# Altium footprint library Sajad_Altium_Library.PcbLib: 333 footprints (part 4 of 21)
Each footprint in its own frame and in the unit in brackets; x right, y up, seen from the top. Pads: shape width x height; smd on the part's side, far side on the other; paste and mask are expansions set on the pad; w line width, h text height; cw(c..) or ccw(c..) is an arc to the next point about the centre after c.
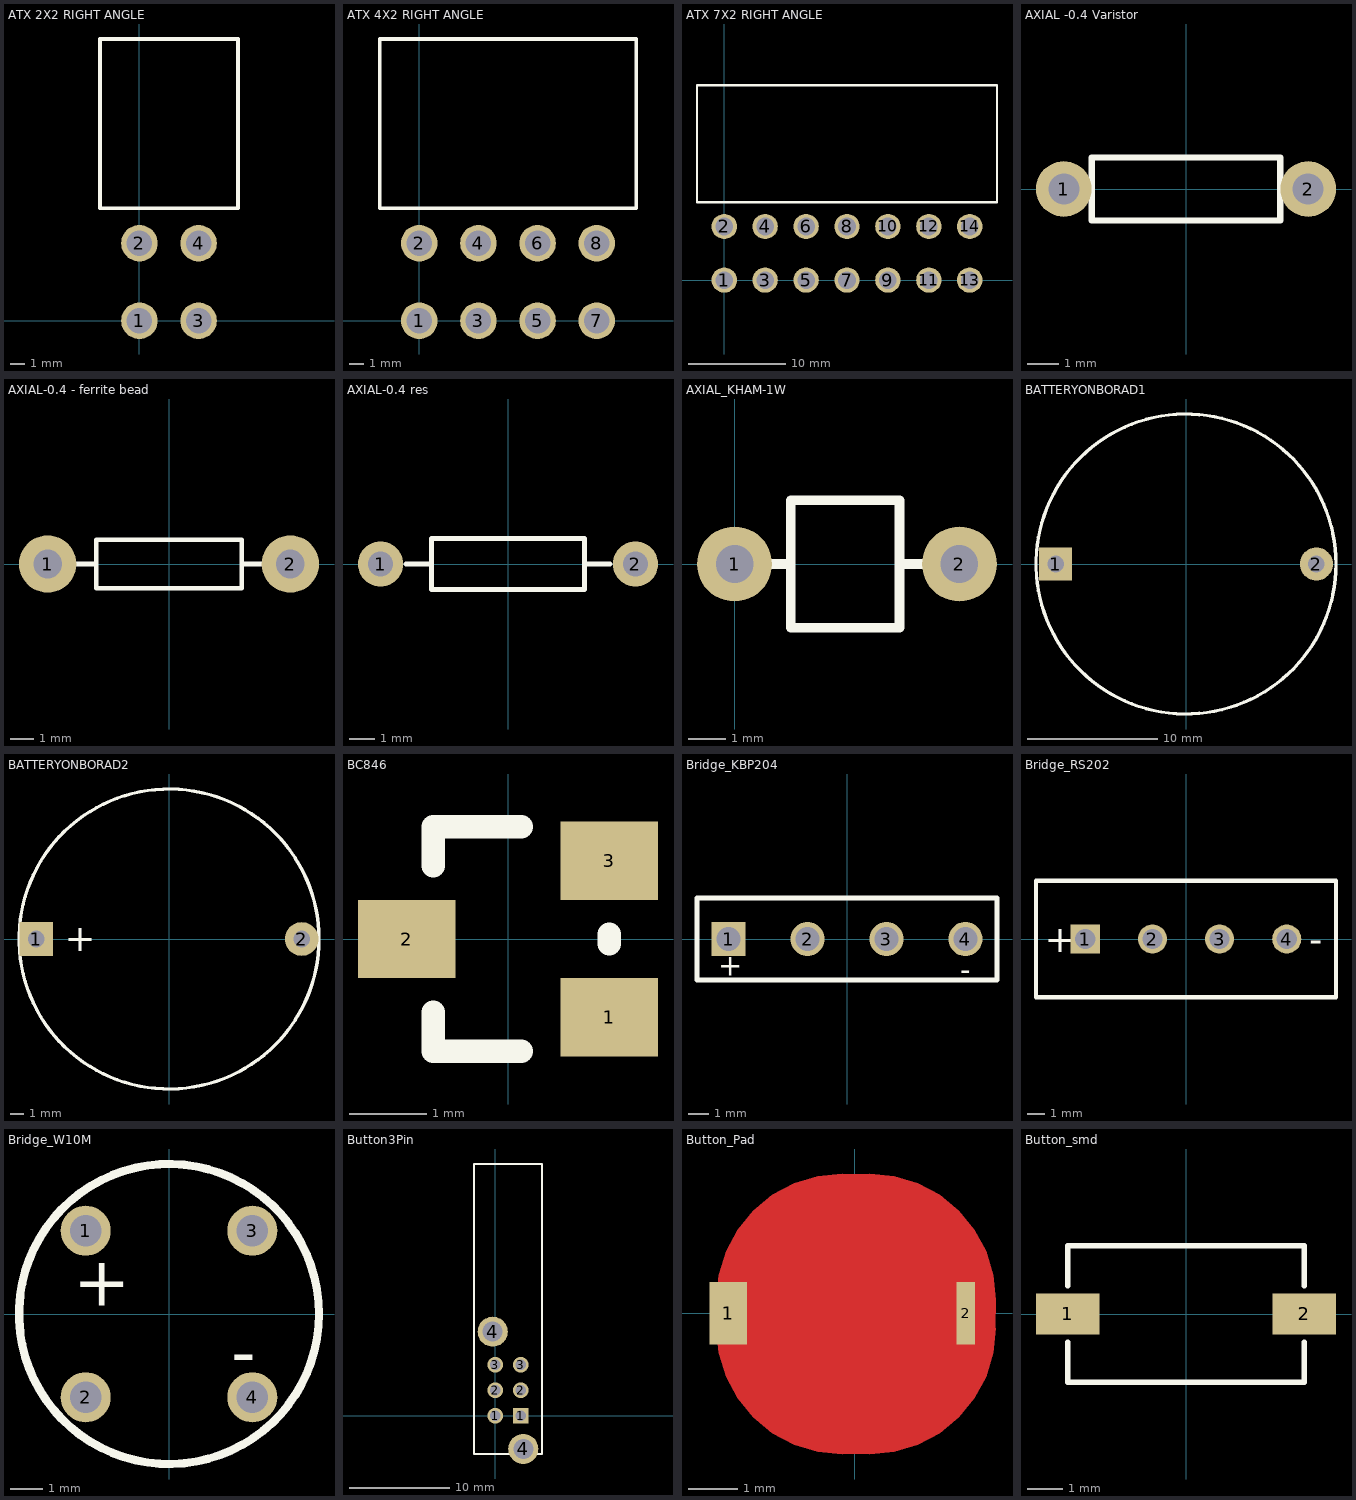
[diagram p3: the footprints below, top view; thin cyan lines are the x and y axes]

## ATX 2X2 RIGHT ANGLE [mm]
pads (4):
  round 2.6 hole 1.8: 1(0,0) 2(0,5.5) 3(4.2,0) 4(4.2,5.5)
Top Overlay:
  lines w0.254: -2.8,7.986 7,7.986 ; -2.8,8 -2.8,20 7,20 7,8

## ATX 4X2 RIGHT ANGLE [mm]
pads (8):
  round 2.6 hole 1.8: 1(0,0) 2(0,5.5) 3(4.2,0) 4(4.2,5.5) 5(8.4,0) 6(8.4,5.5) 7(12.6,0) 8(12.6,5.5)
Top Overlay:
  lines w0.254: -2.8,7.986 15.4,7.986 ; -2.8,8 -2.8,20 15.4,20 15.4,8

## ATX 7X2 RIGHT ANGLE [mm]
pads (14):
  round 2.6 hole 1.8: 1(0,0) 2(0,5.5) 3(4.2,0) 4(4.2,5.5) 5(8.4,0) 6(8.4,5.5) 7(12.6,0) 8(12.6,5.5) 9(16.8,0) 10(16.8,5.5) 11(21,0) 12(21,5.5) 13(25.2,0) 14(25.2,5.5)
Top Overlay:
  lines w0.254: -2.8,7.986 28,7.986 28,20 -2.8,20 -2.8,8

## AXIAL -0.4 Varistor [mm] "Axial Device, Thru-Hole; 2 Leads; 0.4 in Pin Spacing"
height 2.032
pads (2):
  round 1.8 hole 1: 1(-3.95,0) 2(3.95,0)
Top Overlay:
  lines w0.2: -3.048,-1.016 3.048,-1.016 3.048,1.016 -3.048,1.016 -3.048,-1.016

## AXIAL-0.4 - ferrite bead [mm] "Axial Device, Thru-Hole; 2 Leads; 0.4 in Pin Spacing"
height 2.032
pads (2):
  round 2.4 hole 1.2: 1(-5.08,0) 2(5.08,0)
Top Overlay:
  lines w0.2: -4.064,0 -3.048,0 ; 3.048,0 4.064,0 ; -3.048,-1.016 -3.048,1.016 3.048,1.016 3.048,-1.016 -3.048,-1.016
3D body: height 2.75, standoff -3, extent -5.25,-1.25 5.25,1.25

## AXIAL-0.4 res [mm] "Axial Device, Thru-Hole; 2 Leads; 0.4 in Pin Spacing"
height 2.032
pads (2):
  round 1.8 hole 1: 1(-5.08,0) 2(5.08,0)
Top Overlay:
  lines w0.2: -4.064,0 -3.048,0 ; 3.048,0 4.064,0 ; -3.048,-1.016 -3.048,1.016 3.048,1.016 3.048,-1.016 -3.048,-1.016
3D body: height 2.43, standoff -3.04, extent -5.385,-1.156 5.385,1.156

## AXIAL_KHAM-1W [mm]
pads (2):
  round 2 hole 1: 1(0,0) 2(6,0)
Top Overlay:
  lines w0.254: 0,0 1.5,0 ; 4.4,0 6,0 ; 1.5,-1.7 1.5,1.7 4.4,1.7 4.4,-1.7 1.5,-1.7

## BATTERYONBORAD1 [mm]
pads (2):
  rect 2.54x2.54 hole 1.27: 1(-10,0)
  round 2.54 hole 1.27: 2(10,0)
Top Overlay:
  circle w0.254: c0,0 r11.5
3D body: height 8.71, standoff -3.97, extent -12.288,-11.39 16.352,11.39

## BATTERYONBORAD2 [mm]
pads (2):
  rect 2.54x2.54 hole 1.27: 1(-10,0)
  round 2.54 hole 1.27: 2(10,0)
Top Overlay:
  circle w0.254: c0,0 r11.3
  text "+" at -7.849,-0.94 h2.03
3D body: height 3.55, standoff -5.5, extent -14.5,-10 14.5,10

## BC846 [mil]
pads (3):
  rect 50x40 smd: 1(51.75,-40) 2(-51.75,0) 3(51.75,40)
Top Overlay:
  lines w12: -38.25,-37.5 -38.25,-57.5 6.75,-57.5 ; -38.25,37.5 -38.25,57.5 6.75,57.5 ; 51.75,-2.5 51.75,2.5
3D body: height 39.37, standoff -3.94, extent -59.53,-59.06 64.01,59.05

## Bridge_KBP204 [mil] "KBP204 Diode Bridge"
pads (4):
  rect 65x65 hole 45: 1(-225,0)
  round 65 hole 45: 2(-75,0) 3(75,0) 4(225,0)
Top Overlay:
  lines w10: -285,-78 0,-78 285,-78 285,78 0,78 -285,78 -285,-78
  text "-" at 215,-78 h40
  text "+" at -245,-70 h40

## Bridge_RS202 [mil] "RS202 Diode Bridge"
pads (4):
  rect 65x65 hole 45: 1(-225,0)
  round 65 hole 45: 2(-75,0) 3(75,0) 4(225,0)
Top Overlay:
  lines w10: -335,-130 -335,130 0,130 335,130 335,-130 0,-130 -335,-130
  text "+" at -315,-30 h60
  text "-" at 275,-30 h60
3D body: height 452.76, standoff -500, extent -291.99,-102.24 281.99,95

## Bridge_W10M [mil] "W10M Diode Bridge"
pads (4):
  round 60 hole 38: 1(-100,100) 2(-100,-100) 3(100,100) 4(100,-100)
Top Overlay:
  circle w10: c0,0 r180
  text "+" at -115,10 h60
  text "-" at 75,-75 h60

## Button3Pin [mil] "Button3Pin"
pads (8):
  round 62 hole 42: 1(0,0) 2(0,100) 2(100,100) 3(0,200) 3(100,200)
  rect 62x62 hole 42: 1(100,0)
  round 118.11 hole 78.74: 4(-10,330) 4(110,-130)
Top Overlay:
  lines w7.87: -83.86,-150 -83.86,987.8 183.86,987.8 183.86,-150 -83.86,-150

## Button_Pad [mil]
pads (2):
  rect 30x50 smd: 1(-101,0)
  rect 15x50 smd: 2(88.58,0)
Top Layer:
  pour cut-out: -110.48,-12 -108.55,-31.6 -102.83,-50.45 -93.55,-67.83 -81.05,-83.05 -65.83,-95.55 -48.45,-104.83 -29.6,-110.55 -10,-112.48 -10,-112 12,-112.48 31.6,-110.55 50.45,-104.83 67.83,-95.55 83.05,-83.05 95.55,-67.83 104.83,-50.45 110.55,-31.6 112.48,-12 112,-12 112.48,11 110.55,30.6 104.83,49.45 95.55,66.83 83.05,82.05 67.83,94.55 50.45,103.83 31.6,109.55 12,111.48 12,111 -10,111.48 -29.6,109.55 -48.45,103.83 -65.83,94.55 -81.05,82.05 -93.55,66.83 -102.83,49.45 -108.55,30.6 -110.48,11 -110,11
  lines w17.72: -84,28 49,28 ; -83,-28 50,-28 ; -60,0 88.58,0 ; -28,84 29,84 ; -27,-84 27,-84 ; -21,-56 67.97,-56 ; -19,56 68,56 ; 27.11,-84.33 cw(c0,0) 28.53,83.86 ; 68.37,-56.33 ccw(c0,0) 68.38,56.31
Top Solder:
  circle w120: c0,0 r40

## Button_smd [mil]
height 220.47
pads (2):
  rect 70x45 smd: 1(-130,0) 2(130,0)
Top Overlay:
  lines w6: -130,-31 -130,-75 130,-75 130,-31 ; -130,31 -130,75 130,75 130,31
3D body: height 98.43, standoff 0, extent -157.48,-75 157.48,70.67